# Altium footprint library Connectors SMD.PcbLib: 130 footprints (part 11 of 12) (continued)
## TYCO_120521-1 [mm] "2x32 Position, 1mm Centerline, Surface Mount, Stacking Board-to-Board Female Connector (IEEE 1386 Mezzanine Connector)"
height 5.4
pads (66):
  rect 0.6x2.4 smd: 1(-15.5,-1.8) 2(-15.5,1.8) 3(-14.5,-1.8) 4(-14.5,1.8) 5(-13.5,-1.8) 6(-13.5,1.8) 7(-12.5,-1.8) 8(-12.5,1.8) 9(-11.5,-1.8) 10(-11.5,1.8) 11(-10.5,-1.8) 12(-10.5,1.8) 13(-9.5,-1.8) 14(-9.5,1.8) 15(-8.5,-1.8) 16(-8.5,1.8) 17(-7.5,-1.8) 18(-7.5,1.8) 19(-6.5,-1.8) 20(-6.5,1.8) 21(-5.5,-1.8) 22(-5.5,1.8) 23(-4.5,-1.8) 24(-4.5,1.8) 25(-3.5,-1.8) 26(-3.5,1.8) 27(-2.5,-1.8) 28(-2.5,1.8) 29(-1.5,-1.8) 30(-1.5,1.8) 31(-0.5,-1.8) 32(-0.5,1.8) 33(0.5,-1.8) 34(0.5,1.8) 35(1.5,-1.8) 36(1.5,1.8) 37(2.5,-1.8) 38(2.5,1.8) 39(3.5,-1.8) 40(3.5,1.8) 41(4.5,-1.8) 42(4.5,1.8) 43(5.5,-1.8) 44(5.5,1.8) 45(6.5,-1.8) 46(6.5,1.8) 47(7.5,-1.8) 48(7.5,1.8) 49(8.5,-1.8) 50(8.5,1.8) 51(9.5,-1.8) 52(9.5,1.8) 53(10.5,-1.8) 54(10.5,1.8) 55(11.5,-1.8) 56(11.5,1.8) 57(12.5,-1.8) 58(12.5,1.8) 59(13.5,-1.8) 60(13.5,1.8) 61(14.5,-1.8) 62(14.5,1.8) 63(15.5,-1.8) 64(15.5,1.8)
  round 1 hole 1.5 unplated: 65(-17.2,0) 66(17.2,0)
Top Overlay:
  circle w0.25: c-15.5,-3.6 r0.125
  lines w0.2: -17.95,-0.6 -17.95,-3.025 -16.2,-3.025 -16.2,-1.46 -16.56,-1.46 cw(c-16.56,-0.91) -17.11,-0.91 ; -17.95,0.6 -17.95,3.025 -16.2,3.025 -16.2,1.46 -16.56,1.46 ccw(c-16.56,0.91) -17.11,0.91 ; -16.6,-0.69 -16.1,-0.69 ; -16.6,0.69 -16.1,0.69 ; -16.4,-0.69 -16.4,-0.345 ; -16.4,-0.396 -16.1,-0.396 ; -16.4,0.345 -16.4,0.69 ; -16.4,0.396 -16.1,0.396 ; 16.1,-0.69 16.6,-0.69 ; 16.1,-0.396 16.4,-0.396 ; 16.1,0.396 16.4,0.396 ; 16.1,0.69 16.6,0.69 ; 16.4,-0.69 16.4,-0.345 ; 16.4,0.345 16.4,0.69 ; 17.11,-0.91 cw(c16.56,-0.91) 16.56,-1.46 16.2,-1.46 16.2,-3.025 17.95,-3.025 17.95,-0.6 ; 17.11,0.91 ccw(c16.56,0.91) 16.56,1.46 16.2,1.46 16.2,3.025 17.95,3.025 17.95,0.6
Mechanical 8:
  lines w0.1: -1,0 0,0 0,-1
Mechanical 14:
  drawing of 608 lines, arcs and shapes, not listed
Mechanical 15:
  lines w0.05: -18.2,-3.275 -18.2,3.275 18.2,3.275 18.2,-3.275 -18.2,-3.275
3D body: height 5.4, standoff -0.73, extent -17.95,-3.025 17.95,3.025

## TYCO_120527-1 [mm] "1mm Centerline, FH (IEEE 1386) Surface Mount, Stacking Board-to-Board Male Connectors"
height 8.45
pads (66):
  rect 0.6x2.7 smd: 1(-15.5,1.65) 2(-15.5,-1.65) 3(-14.5,1.65) 4(-14.5,-1.65) 5(-13.5,1.65) 6(-13.5,-1.65) 7(-12.5,1.65) 8(-12.5,-1.65) 9(-11.5,1.65) 10(-11.5,-1.65) 11(-10.5,1.65) 12(-10.5,-1.65) 13(-9.5,1.65) 14(-9.5,-1.65) 15(-8.5,1.65) 16(-8.5,-1.65) 17(-7.5,1.65) 18(-7.5,-1.65) 19(-6.5,1.65) 20(-6.5,-1.65) 21(-5.5,1.65) 22(-5.5,-1.65) 23(-4.5,1.65) 24(-4.5,-1.65) 25(-3.5,1.65) 26(-3.5,-1.65) 27(-2.5,1.65) 28(-2.5,-1.65) 29(-1.5,1.65) 30(-1.5,-1.65) 31(-0.5,1.65) 32(-0.5,-1.65) 33(0.5,1.65) 34(0.5,-1.65) 35(1.5,1.65) 36(1.5,-1.65) 37(2.5,1.65) 38(2.5,-1.65) 39(3.5,1.65) 40(3.5,-1.65) 41(4.5,1.65) 42(4.5,-1.65) 43(5.5,1.65) 44(5.5,-1.65) 45(6.5,1.65) 46(6.5,-1.65) 47(7.5,1.65) 48(7.5,-1.65) 49(8.5,1.65) 50(8.5,-1.65) 51(9.5,1.65) 52(9.5,-1.65) 53(10.5,1.65) 54(10.5,-1.65) 55(11.5,1.65) 56(11.5,-1.65) 57(12.5,1.65) 58(12.5,-1.65) 59(13.5,1.65) 60(13.5,-1.65) 61(14.5,1.65) 62(14.5,-1.65) 63(15.5,1.65) 64(15.5,-1.65)
  round 1 hole 1.5 unplated: 65(-17.2,0) 66(17.2,0)
Top Overlay:
  circle w0.25: c-15.5,3.6 r0.125
  lines w0.2: -17.95,-1.275 ccw(c-16.95,-1.275) -16.95,-2.275 ; -17.95,-1 -17.95,-3.025 -16.95,-3.025 -16.95,-2.275 ; -17.95,1 -17.95,3.025 -16.95,3.025 -16.95,2.275 ; -17.95,1.275 cw(c-16.95,1.275) -16.95,2.275 ; -17.29,-1 -17.29,-1.2 ccw(c-16.84,-1.2) -16.84,-1.65 -16.3,-1.65 -16.3,-2 -16,-2 ; -17.29,1 -17.29,1.2 cw(c-16.84,1.2) -16.84,1.65 -16.3,1.65 -16.3,2 -16,2 ; -16.15,-0.5 -16.15,0.5 ; -16.15,0 16.15,0 ; -16,-2.575 -16.75,-2.575 -16.75,-2.275 -16.95,-2.275 ; -16,2.575 -16.75,2.575 -16.75,2.275 -16.95,2.275 ; 16,-2.575 16.75,-2.575 16.75,-2.275 16.95,-2.275 ; 16,-2 16.3,-2 16.3,-1.65 16.84,-1.65 ccw(c16.84,-1.2) 17.29,-1.2 17.29,-1 ; 16,2 16.3,2 16.3,1.65 16.84,1.65 cw(c16.84,1.2) 17.29,1.2 17.29,1 ; 16,2.575 16.75,2.575 16.75,2.275 16.95,2.275 ; 16.15,-0.5 16.15,0.5 ; 17.95,-1.275 cw(c16.95,-1.275) 16.95,-2.275 ; 17.95,-1 17.95,-3.025 16.95,-3.025 16.95,-2.275 ; 17.95,1 17.95,3.025 16.95,3.025 16.95,2.275 ; 17.95,1.275 ccw(c16.95,1.275) 16.95,2.275
Mechanical 14:
  drawing of 251 lines, arcs and shapes, not listed
Mechanical 15:
  lines w0.05: -18.2,-3.275 -18.2,3.275 18.2,3.275 18.2,-3.275 -18.2,-3.275
3D body: height 8.38, standoff -0.73, extent -17.95,-3.025 17.95,3.025

## TYCO_767139-3 [mm] "114 Positions, Pitch 25 [0.64], Centerline Matched Impedance Vertical Plug (MICTOR)"
height 9.14
pads (130):
  rect 0.43x1.27 smd: 1(-18.415,3.531) 2(-18.415,-3.531) 3(-17.78,3.531) 4(-17.78,-3.531) 5(-17.145,3.531) 6(-17.145,-3.531) 7(-16.51,3.531) 8(-16.51,-3.531) 9(-15.875,3.531) 10(-15.875,-3.531) 11(-15.24,3.531) 12(-15.24,-3.531) 13(-14.605,3.531) 14(-14.605,-3.531) 15(-13.97,3.531) 16(-13.97,-3.531) 17(-13.335,3.531) 18(-13.335,-3.531) 19(-12.7,3.531) 20(-12.7,-3.531) 21(-12.065,3.531) 22(-12.065,-3.531) 23(-11.43,3.531) 24(-11.43,-3.531) 25(-10.795,3.531) 26(-10.795,-3.531) 27(-10.16,3.531) 28(-10.16,-3.531) 29(-9.525,3.531) 30(-9.525,-3.531) 31(-8.89,3.531) 32(-8.89,-3.531) 33(-8.255,3.531) 34(-8.255,-3.531) 35(-7.62,3.531) 36(-7.62,-3.531) 37(-6.985,3.531) 38(-6.985,-3.531) 39(-5.715,3.531) 40(-5.715,-3.531) 41(-5.08,3.531) 42(-5.08,-3.531) 43(-4.445,3.531) 44(-4.445,-3.531) 45(-3.81,3.531) 46(-3.81,-3.531) 47(-3.175,3.531) 48(-3.175,-3.531) 49(-2.54,3.531) 50(-2.54,-3.531) 51(-1.905,3.531) 52(-1.905,-3.531) 53(-1.27,3.531) 54(-1.27,-3.531) 55(-0.635,3.531) 56(-0.635,-3.531) 57(0,3.531) 58(0,-3.531) 59(0.635,3.531) 60(0.635,-3.531) 61(1.27,3.531) 62(1.27,-3.531) 63(1.905,3.531) 64(1.905,-3.531) 65(2.54,3.531) 66(2.54,-3.531) 67(3.175,3.531) 68(3.175,-3.531) 69(3.81,3.531) 70(3.81,-3.531) 71(4.445,3.531) 72(4.445,-3.531) 73(5.08,3.531) 74(5.08,-3.531) 75(5.715,3.531) 76(5.715,-3.531) 77(6.985,3.531) 78(6.985,-3.531) 79(7.62,3.531) 80(7.62,-3.531) 81(8.255,3.531) 82(8.255,-3.531) 83(8.89,3.531) 84(8.89,-3.531) 85(9.525,3.531) 86(9.525,-3.531) 87(10.16,3.531) 88(10.16,-3.531) 89(10.795,3.531) 90(10.795,-3.531) 91(11.43,3.531) 92(11.43,-3.531) 93(12.065,3.531) 94(12.065,-3.531) 95(12.7,3.531) 96(12.7,-3.531) 97(13.335,3.531) 98(13.335,-3.531) 99(13.97,3.531) 100(13.97,-3.531) 101(14.605,3.531) 102(14.605,-3.531) 103(15.24,3.531) 104(15.24,-3.531) 105(15.875,3.531) 106(15.875,-3.531) 107(16.51,3.531) 108(16.51,-3.531) 109(17.145,3.531) 110(17.145,-3.531) 111(17.78,3.531) 112(17.78,-3.531) 113(18.415,3.531) 114(18.415,-3.531)
  round 1.5 hole 0.8: 115(17.78,0) 116(15.24,0) 117(12.7,0) 118(10.16,0) 119(7.62,0) 120(5.08,0) 121(2.54,0) 122(0,0) 123(-2.54,0) 124(-5.08,0) 125(-7.62,0) 126(-10.16,0) 127(-12.7,0) 128(-15.24,0) 129(-17.78,0)
  round 1 hole 2 unplated: 130(-24.13,0)
Top Overlay:
  circle w0.25: c-18.415,4.716 r0.125
  lines w0.2: -25.4,-0.798 -25.4,-1.524 -24.105,-1.524 ; -25.4,0.798 -25.4,1.524 -24.105,1.524 ; -24.105,-1.5 -24.105,-2.642 24.105,-2.642 24.105,-0.635 19.66,-0.635 ; -24.105,1.5 -24.105,1.524 ; -23.707,-1.439 -22.504,-2.642 ; -23.546,2.083 -23.343,1.88 ; -23.343,-1.803 -23.343,-1.277 ; -23.343,1.277 -23.343,1.88 ; -23.266,-1.88 -20.422,-1.88 ; -22.771,-0.635 -19.66,-0.635 ; -22.771,0.635 -22.2,0.635 ; -22.2,-0.635 -22.2,1.27 -19.66,1.27 ; -20.422,-0.635 -20.422,-1.88 ; -20.422,1.27 -20.422,1.88 ; -19.982,-2.642 -20.422,-1.88 ; -19.982,2.642 -20.422,1.88 ; -19.66,-2.642 -19.66,2.642 ; -19.66,-1.714 19.66,-1.714 ; -19.66,1.714 19.66,1.714 ; -6.858,-2.642 -6.858,-1.714 ; -6.858,1.714 -6.858,2.642 ; -5.842,-2.642 -5.842,-1.714 ; -5.842,1.714 -5.842,2.642 ; 5.842,-2.642 5.842,-1.714 ; 5.842,1.714 5.842,2.642 ; 6.858,-2.642 6.858,-1.714 ; 6.858,1.714 6.858,2.642 ; 19.66,-2.642 19.66,2.642 ; 19.66,1.27 22.2,1.27 22.2,-0.635 ; 19.982,-2.642 20.422,-1.88 ; 19.982,2.642 20.422,1.88 ; 20.422,-0.635 20.422,-1.88 ; 20.422,1.27 20.422,1.88 ; 22.2,0.635 24.105,0.635 24.105,1.524 ; 22.504,-2.642 24.105,-1.041 ; 23.266,-1.88 20.422,-1.88 ; 23.343,-1.803 23.343,-0.635 ; 23.343,0.635 23.343,1.88 ; 23.546,2.083 23.343,1.88 ; 24.105,-1.524 25.4,-1.524 25.4,1.524 24.105,1.524 ; -24.105,1.524 -22.987,2.642 22.987,2.642 24.105,1.524 ; -23.343,1.88 -20.422,1.88 ; 20.422,1.88 23.343,1.88
  text "113" at 19.075,3.05 h1
  text "114" at 19.1,-4.025 h1
  text "1" at -19.625,2.95 h1
  text "2" at -19.6,-4.025 h1
Mechanical 8:
  drawing of 812 lines, arcs and shapes, not listed
Mechanical 14:
  drawing of 446 lines, arcs and shapes, not listed
Mechanical 15:
  lines w0.1: -25.65,-4.416 25.65,-4.416 25.65,4.416 -25.65,4.416 -25.65,-4.416
3D body: height 8.86, standoff -1.52, extent -25.4,-4.166 25.4,4.166

## TYCO_969973-5 [mm] "AMPMODU, Pitch 2.54mm, 10 contacts, 2 Rows, Surface Mount Vertical Receptacle"
height 6.2
pads (10):
  rect 1.5x2.33 smd: 1(-5.08,3.035) 2(-5.08,-3.035) 3(-2.54,3.035) 4(-2.54,-3.035) 5(0,3.035) 6(0,-3.035) 7(2.54,3.035) 8(2.54,-3.035) 9(5.08,3.035) 10(5.08,-3.035)
Top Overlay:
  circle w0.25: c-5.08,5.08 r0.125
  lines w0.2: -6.13,-2.53 -6.25,-2.53 -6.25,2.53 -6.13,2.53 ; -4.03,-2.53 -3.59,-2.53 ; -4.03,2.53 -3.59,2.53 ; -1.49,-2.53 -1.05,-2.53 ; -1.49,2.53 -1.05,2.53 ; 1.05,-2.53 1.49,-2.53 ; 1.05,2.53 1.49,2.53 ; 3.59,-2.53 4.03,-2.53 ; 3.59,2.53 4.03,2.53 ; 6.13,-2.53 6.25,-2.53 6.25,2.53 6.13,2.53
Mechanical 8:
  lines w0.1: -5.58,-3.035 -5.08,-3.035 ; -5.58,3.035 -5.08,3.035 ; -5.08,-3.535 -5.08,-3.035 ; -5.08,-2.535 -5.08,-3.035 ; -5.08,2.535 -5.08,3.035 ; -5.08,3.535 -5.08,3.035 ; -4.58,-3.035 -5.08,-3.035 ; -4.58,3.035 -5.08,3.035 ; -3.04,-3.035 -2.54,-3.035 ; -3.04,3.035 -2.54,3.035 ; -2.54,-3.535 -2.54,-3.035 ; -2.54,-2.535 -2.54,-3.035 ; -2.54,2.535 -2.54,3.035 ; -2.54,3.535 -2.54,3.035 ; -2.04,-3.035 -2.54,-3.035 ; -2.04,3.035 -2.54,3.035 ; -0.5,-3.035 0,-3.035 ; -0.5,0 0,0 ; -0.5,3.035 0,3.035 ; 0,-3.535 0,-3.035 ; 0,-2.535 0,-3.035 ; 0,-0.5 0,0 ; 0,0.5 0,0 ; 0,2.535 0,3.035 ; 0,3.535 0,3.035 ; 0.5,-3.035 0,-3.035 ; 0.5,0 0,0 ; 0.5,3.035 0,3.035 ; 2.04,-3.035 2.54,-3.035 ; 2.04,3.035 2.54,3.035 ; 2.54,-3.535 2.54,-3.035 ; 2.54,-2.535 2.54,-3.035 ; 2.54,2.535 2.54,3.035 ; 2.54,3.535 2.54,3.035 ; 3.04,-3.035 2.54,-3.035 ; 3.04,3.035 2.54,3.035 ; 4.58,-3.035 5.08,-3.035 ; 4.58,3.035 5.08,3.035 ; 5.08,-3.535 5.08,-3.035 ; 5.08,-2.535 5.08,-3.035 ; 5.08,2.535 5.08,3.035 ; 5.08,3.535 5.08,3.035 ; 5.58,-3.035 5.08,-3.035 ; 5.58,3.035 5.08,3.035 ; -5.83,-4.2 -4.33,-4.2 -4.33,-1.87 -5.83,-1.87 -5.83,-4.2 ; -5.83,1.87 -5.83,4.2 -4.33,4.2 -4.33,1.87 -5.83,1.87 ; -3.29,-4.2 -1.79,-4.2 -1.79,-1.87 -3.29,-1.87 -3.29,-4.2 ; -3.29,1.87 -3.29,4.2 -1.79,4.2 -1.79,1.87 -3.29,1.87 ; -0.75,-4.2 0.75,-4.2 0.75,-1.87 -0.75,-1.87 -0.75,-4.2 ; -0.75,1.87 -0.75,4.2 0.75,4.2 0.75,1.87 -0.75,1.87 ; 1.79,-4.2 3.29,-4.2 3.29,-1.87 1.79,-1.87 1.79,-4.2 ; 1.79,1.87 1.79,4.2 3.29,4.2 3.29,1.87 1.79,1.87 ; 4.33,-4.2 5.83,-4.2 5.83,-1.87 4.33,-1.87 4.33,-4.2 ; 4.33,1.87 4.33,4.2 5.83,4.2 5.83,1.87 4.33,1.87
Mechanical 14:
  lines w0.1: -8.325,-1.5 -7.675,-1.5 ; -8.325,0.5 -7.675,0.5 ; -5.43,-2.53 -5.43,-3.81 -4.73,-3.81 -4.73,-2.53 ; -5.43,2.53 -5.43,3.81 -4.73,3.81 -4.73,2.53 ; -2.89,-2.53 -2.89,-3.81 -2.19,-3.81 -2.19,-2.53 ; -2.89,2.53 -2.89,3.81 -2.19,3.81 -2.19,2.53 ; -0.35,-2.53 -0.35,-3.81 0.35,-3.81 0.35,-2.53 ; -0.35,2.53 -0.35,3.81 0.35,3.81 0.35,2.53 ; 2.19,-2.53 2.19,-3.81 2.89,-3.81 2.89,-2.53 ; 2.19,2.53 2.19,3.81 2.89,3.81 2.89,2.53 ; 4.73,-2.53 4.73,-3.81 5.43,-3.81 5.43,-2.53 ; 4.73,2.53 4.73,3.81 5.43,3.81 5.43,2.53 ; 7.675,-0.5 8.325,-0.5 ; 7.675,1.5 8.325,1.5 ; -8.325,-3.15 8.325,-3.15 ; -8.325,-3.15 -7.675,-2.5 ; -8.325,-3.15 -8.325,3.15 ; -8.325,3.15 8.325,3.15 ; -8.325,3.15 -7.675,2.5 ; -7.675,-2.5 -7.675,2.5 ; -7.675,-2.5 7.675,-2.5 ; -7.675,2.5 7.675,2.5 ; 7.675,-2.5 7.675,2.5 ; 7.675,-2.5 8.325,-3.15 ; 7.675,-2.5 8.325,-3.15 ; 7.675,2.5 8.325,3.15 ; 7.675,2.5 8.325,3.15 ; 8.325,-3.15 8.325,3.15 ; -6.5,-4.25 -5.5,-4.25 -6,-3.75 -6.5,-4.25 ; -6.25,-2.53 -6.25,2.53 6.25,2.53 6.25,-2.53 -6.25,-2.53
Mechanical 15:
  lines w0.1: -6.5,-4.45 -6.5,4.45 6.5,4.45 6.5,-4.45 -6.5,-4.45
3D body: height 6.2, standoff 0, extent -6.25,-3.81 6.25,3.81

## TYCO_1367073-1 [mm] "20 Position, Pitch 0.8mm SFP Receptacle (Small Form-factor Pluggable)"
height 5.4
pads (22):
  rect 2x0.5 smd: 1(-4.1,3.395) 2(-4.1,2.595) 3(-4.1,1.795) 4(-4.1,0.995) 5(-4.1,0.195) 6(-4.1,-0.605) 7(-4.1,-1.405) 8(-4.1,-2.205) 9(-4.1,-3.005) 10(-4.1,-3.805) 11(4.1,-3.405) 12(4.1,-2.605) 13(4.1,-1.805) 14(4.1,-1.005) 15(4.1,-0.205) 16(4.1,0.595) 17(4.1,1.395) 18(4.1,2.195) 19(4.1,2.995) 20(4.1,3.795)
  round 1 hole 1.55 unplated mask+0.28: MTG1(0,4.795) MTG2(0,-4.805)
Top Layer keep-out:
  lines w0.1: -4.34,-5.755 -4.34,-4.395 -2.88,-4.395 -2.88,-3.855 2.88,-3.855 2.88,-3.995 3.94,-3.995 3.94,-4.805 3.94,-5.755 -4.34,-5.755 ; -4.34,3.985 -4.34,5.745 3.94,5.745 3.94,4.385 2.88,4.385 2.88,3.845 -2.88,3.845 -2.88,3.985 -4.34,3.985
Top Overlay:
  circle w0.25: c-4.955,4.318 r0.125
  lines w0.2: -40,-7.774 -42.4,-7.774 -42.4,7.774 -40,7.774 ; -4,-4.505 -4,-5.505 -0.944,-5.505 ; -3.7,-5.505 -3.7,-4.505 ; -3.7,-5.305 -2.98,-4.705 -2.98,-4.505 ; -3.7,4.045 -3.7,5.495 ; -3.7,4.095 -4,4.095 -4,5.495 -0.944,5.495 ; -3.7,4.432 -2.98,4.495 ; -3.7,5.295 -2.98,4.695 -2.98,4.045 ; -3.223,4.045 -3.223,4.474 ; 0.944,-5.505 2.9,-5.505 3.7,-4.705 3.7,-4.055 ; 0.944,5.495 3.7,5.495 3.7,4.445 ; 5.5,-7.774 6.3,-7.774 6.3,-5.777 ; 5.5,7.774 6.3,7.774 6.3,5.777
Mechanical 8:
  circle w0.1: c0,-4.805 r0.775
  circle w0.1: c0,4.795 r0.775
  lines w0.1: -4.6,-3.805 -4.1,-3.805 -3.6,-3.805 ; -4.6,-3.005 -4.1,-3.005 -3.6,-3.005 ; -4.6,-2.205 -4.1,-2.205 -3.6,-2.205 ; -4.6,-1.405 -4.1,-1.405 -3.6,-1.405 ; -4.6,-0.605 -4.1,-0.605 -3.6,-0.605 ; -4.6,0.195 -4.1,0.195 -3.6,0.195 ; -4.6,0.995 -4.1,0.995 -3.6,0.995 ; -4.6,1.795 -4.1,1.795 -3.6,1.795 ; -4.6,2.595 -4.1,2.595 -3.6,2.595 ; -4.6,3.395 -4.1,3.395 -3.6,3.395 ; -4.1,-4.305 -4.1,3.895 ; -0.5,-4.805 0,-4.805 ; -0.5,0 0,0 ; -0.5,4.795 0,4.795 ; 0,-5.305 0,-4.805 ; 0,-4.305 0,-4.805 ; 0,-0.5 0,0 ; 0,0.5 0,0 ; 0,4.295 0,4.795 ; 0,5.295 0,4.795 ; 0.5,-4.805 0,-4.805 ; 0.5,0 0,0 ; 0.5,4.795 0,4.795 ; 3.6,-3.405 4.1,-3.405 4.6,-3.405 ; 3.6,-2.605 4.1,-2.605 4.6,-2.605 ; 3.6,-1.805 4.1,-1.805 4.6,-1.805 ; 3.6,-1.005 4.1,-1.005 4.6,-1.005 ; 3.6,-0.205 4.1,-0.205 4.6,-0.205 ; 3.6,0.595 4.1,0.595 4.6,0.595 ; 3.6,1.395 4.1,1.395 4.6,1.395 ; 3.6,2.195 4.1,2.195 4.6,2.195 ; 3.6,2.995 4.1,2.995 4.6,2.995 ; 3.6,3.795 4.1,3.795 4.6,3.795 ; 4.1,-3.905 4.1,4.295
Mechanical 14:
  circle w0.1: c-4.955,4.318 r0.125
  lines w0.1: -3.7,-5.505 -3.7,-4.105 ; -3.7,-5.305 -2.98,-4.705 -2.98,-4.505 ; -3.7,-4.442 -2.98,-4.505 ; -3.7,-4.055 -5.1,-4.055 -5.1,-3.555 -3.7,-3.555 ; -3.7,-3.255 -5.1,-3.255 -5.1,-2.755 -3.7,-2.755 ; -3.7,-2.455 -5.1,-2.455 -5.1,-1.955 -3.7,-1.955 ; -3.7,-1.655 -5.1,-1.655 -5.1,-1.155 -3.7,-1.155 ; -3.7,-0.855 -5.1,-0.855 -5.1,-0.355 -3.7,-0.355 ; -3.7,-0.055 -5.1,-0.055 -5.1,0.445 -3.7,0.445 ; -3.7,0.745 -5.1,0.745 -5.1,1.245 -3.7,1.245 ; -3.7,1.545 -5.1,1.545 -5.1,2.045 -3.7,2.045 ; -3.7,2.345 -5.1,2.345 -5.1,2.845 -3.7,2.845 ; -3.7,3.145 -5.1,3.145 -5.1,3.645 -3.7,3.645 ; -3.7,4.432 -2.98,4.495 ; -3.7,5.295 -2.985,4.695 -2.98,4.695 -2.98,4.495 ; -3.7,5.495 -3.7,4.095 ; -3.223,-4.484 -3.223,4.474 ; 3.7,-3.655 5.1,-3.655 5.1,-3.155 3.7,-3.155 ; 3.7,-2.855 5.1,-2.855 5.1,-2.355 3.7,-2.355 ; 3.7,-2.055 5.1,-2.055 5.1,-1.555 3.7,-1.555 ; 3.7,-1.255 5.1,-1.255 5.1,-0.755 3.7,-0.755 ; 3.7,-0.455 5.1,-0.455 5.1,0.045 3.7,0.045 ; 3.7,0.345 5.1,0.345 5.1,0.845 3.7,0.845 ; 3.7,1.145 5.1,1.145 5.1,1.645 3.7,1.645 ; 3.7,1.945 5.1,1.945 5.1,2.445 3.7,2.445 ; 3.7,2.745 5.1,2.745 5.1,3.245 3.7,3.245 ; 3.7,3.545 5.1,3.545 5.1,4.045 3.7,4.045 ; -3.7,-4.105 -3.7,4.095 ; -3.7,-4.105 -4,-4.105 -4,-5.505 2.9,-5.505 3.7,-4.705 3.7,5.495 -4,5.495 -4,4.095 -3.7,4.095 ; -2.98,-4.505 -2.98,4.495
3D body: height 5.22, standoff -0.81, extent -4.5,-5.505 4.5,5.495

## TYCO_1734035-1 [mm] "SMD, Right Angle, 5 Position, Type B, Mini USB Receptacle"
height 3.95
pads (11):
  rect 0.5x2.3 smd: 1(-1.575,0) 2(-0.8,0) 3(0,0) 4(0.8,0) 5(1.6,0)
  rect 2x2.5 smd: 6(-4.45,-5.6) 6(-4.45,-0.1) 6(4.45,-5.6) 6(4.45,-0.1)
  round 0.5 hole 0.9 unplated mask+0.2: MTG1(-2.2,-2.6) MTG2(2.2,-2.6)
Top Overlay:
  drawing of 2951 lines, arcs and shapes, not listed
Mechanical 8:
  circle w0.1: c2.2,-2.6 r0.45
  circle w0.1: c-2.2,-2.6 r0.45
  lines w0.1: -4.95,-5.6 -4.45,-5.6 ; -4.95,-0.1 -4.45,-0.1 ; -4.45,-7.85 0,-7.85 4.45,-7.85 ; -4.45,-6.1 -4.45,-5.6 ; -4.45,-5.1 -4.45,-5.6 ; -4.45,-0.6 -4.45,-0.1 ; -4.45,0.4 -4.45,-0.1 ; -3.95,-5.6 -4.45,-5.6 ; -3.95,-0.1 -4.45,-0.1 ; -2.7,-2.6 -2.2,-2.6 ; -2.2,-3.1 -2.2,-2.6 ; -2.2,-2.1 -2.2,-2.6 ; -2.1,0 -1.6,0 ; -1.7,-2.6 -2.2,-2.6 ; -1.6,-0.5 -1.6,0 ; -1.6,0.5 -1.6,0 ; -0.8,-0.5 -0.8,0 ; -0.8,0.5 -0.8,0 ; 0,-0.5 0,0 ; 0,0.5 0,0 ; 0.8,-0.5 0.8,0 ; 0.8,0.5 0.8,0 ; 1.6,-0.5 1.6,0 ; 1.6,0.5 1.6,0 ; 1.7,-2.6 2.2,-2.6 ; 2.1,0 1.6,0 ; 2.2,-3.1 2.2,-2.6 ; 2.2,-2.1 2.2,-2.6 ; 2.7,-2.6 2.2,-2.6 ; 3.95,-5.6 4.45,-5.6 ; 3.95,-0.1 4.45,-0.1 ; 4.45,-6.1 4.45,-5.6 ; 4.45,-5.1 4.45,-5.6 ; 4.45,-0.6 4.45,-0.1 ; 4.45,0.4 4.45,-0.1 ; 4.95,-5.6 4.45,-5.6 ; 4.95,-0.1 4.45,-0.1 ; -1.6,0 -0.8,0 ; -0.8,0 0,0 ; 0,0 0.8,0 ; 0.8,0 1.6,0 ; -5.45,-6.85 -3.45,-6.85 -3.45,-4.35 -5.45,-4.35 -5.45,-6.85 ; -5.45,-1.35 -3.45,-1.35 -3.45,1.15 -5.45,1.15 -5.45,-1.35 ; -1.85,-1.15 -1.85,1.15 -1.35,1.15 -1.35,-1.15 -1.85,-1.15 ; -1.05,-1.15 -1.05,1.15 -0.55,1.15 -0.55,-1.15 -1.05,-1.15 ; -0.25,-1.15 -0.25,1.15 0.25,1.15 0.25,-1.15 -0.25,-1.15 ; 0.55,-1.15 0.55,1.15 1.05,1.15 1.05,-1.15 0.55,-1.15 ; 1.35,-1.15 1.35,1.15 1.85,1.15 1.85,-1.15 1.35,-1.15 ; 3.45,-6.85 5.45,-6.85 5.45,-4.35 3.45,-4.35 3.45,-6.85 ; 3.45,-1.35 5.45,-1.35 5.45,1.15 3.45,1.15 3.45,-1.35
Mechanical 14:
  drawing of 2963 lines, arcs and shapes, not listed
3D body: height 4.14, standoff -0.95, extent -4.95,-8.5 4.95,0.7

## TYCO_1888247-1 [mm] "20 Position, Pitch 0.8mm SFP Receptacle (Small Form-factor Pluggable)"
height 5.4
pads (22):
  rect 2x0.5 smd: 1(-4.1,3.395) 2(-4.1,2.595) 3(-4.1,1.795) 4(-4.1,0.995) 5(-4.1,0.195) 6(-4.1,-0.605) 7(-4.1,-1.405) 8(-4.1,-2.205) 9(-4.1,-3.005) 10(-4.1,-3.805) 11(4.1,-3.405) 14(4.1,-1.005) 15(4.1,-0.205) 16(4.1,0.595) 17(4.1,1.395) 20(4.1,3.795)
  rect 1.5x0.4 smd: 12(4.1,-2.605) 13(4.1,-1.805) 18(4.1,2.195) 19(4.1,2.995)
  round 1 hole 1.55 unplated mask+0.28: MTG1(0,4.795) MTG2(0,-4.805)
Top Layer keep-out:
  lines w0.1: -4.34,-5.755 3.94,-5.755 3.94,-4.805 3.94,-3.995 2.88,-3.995 2.88,-3.855 -2.88,-3.855 -2.88,-4.395 -4.34,-4.395 -4.34,-5.755 ; -4.34,3.985 -2.88,3.985 -2.88,3.845 2.88,3.845 2.88,4.385 3.94,4.385 3.94,5.745 -4.34,5.745 -4.34,3.985
Top Overlay:
  circle w0.25: c-4.955,4.318 r0.125
  lines w0.2: -40,-7.774 -42.4,-7.774 -42.4,7.774 -40,7.774 ; -4,-4.505 -4,-5.505 -0.944,-5.505 ; -3.7,-5.505 -3.7,-4.505 ; -3.7,-5.305 -2.98,-4.705 -2.98,-4.505 ; -3.7,4.045 -3.7,5.495 ; -3.7,4.095 -4,4.095 -4,5.495 -0.944,5.495 ; -3.7,4.432 -2.98,4.495 ; -3.7,5.295 -2.98,4.695 -2.98,4.045 ; -3.223,4.045 -3.223,4.474 ; 0.944,-5.505 2.9,-5.505 3.7,-4.705 3.7,-4.055 ; 0.944,5.495 3.7,5.495 3.7,4.445 ; 5.5,-7.774 6.3,-7.774 6.3,-5.777 ; 5.5,7.774 6.3,7.774 6.3,5.777
Mechanical 8:
  circle w0.1: c0,4.795 r0.775
  circle w0.1: c0,-4.805 r0.775
  lines w0.1: -4.6,-3.805 -4.1,-3.805 -3.6,-3.805 ; -4.6,-3.005 -4.1,-3.005 -3.6,-3.005 ; -4.6,-2.205 -4.1,-2.205 -3.6,-2.205 ; -4.6,-1.405 -4.1,-1.405 -3.6,-1.405 ; -4.6,-0.605 -4.1,-0.605 -3.6,-0.605 ; -4.6,0.195 -4.1,0.195 -3.6,0.195 ; -4.6,0.995 -4.1,0.995 -3.6,0.995 ; -4.6,1.795 -4.1,1.795 -3.6,1.795 ; -4.6,2.595 -4.1,2.595 -3.6,2.595 ; -4.6,3.395 -4.1,3.395 -3.6,3.395 ; -4.1,-4.305 -4.1,3.895 ; -0.5,-4.805 0,-4.805 ; -0.5,0 0,0 ; -0.5,4.795 0,4.795 ; 0,-5.305 0,-4.805 ; 0,-4.305 0,-4.805 ; 0,-0.5 0,0 ; 0,0.5 0,0 ; 0,4.295 0,4.795 ; 0,5.295 0,4.795 ; 0.5,-4.805 0,-4.805 ; 0.5,0 0,0 ; 0.5,4.795 0,4.795 ; 3.6,-3.405 4.1,-3.405 4.6,-3.405 ; 3.6,-2.605 4.1,-2.605 4.6,-2.605 ; 3.6,-1.805 4.1,-1.805 4.6,-1.805 ; 3.6,-1.005 4.1,-1.005 4.6,-1.005 ; 3.6,-0.205 4.1,-0.205 4.6,-0.205 ; 3.6,0.595 4.1,0.595 4.6,0.595 ; 3.6,1.395 4.1,1.395 4.6,1.395 ; 3.6,2.195 4.1,2.195 4.6,2.195 ; 3.6,2.995 4.1,2.995 4.6,2.995 ; 3.6,3.795 4.1,3.795 4.6,3.795 ; 4.1,-3.905 4.1,4.295
Mechanical 14:
  circle w0.1: c-4.955,4.318 r0.125
  lines w0.1: -3.7,-5.505 -3.7,-4.105 ; -3.7,-5.305 -2.98,-4.705 -2.98,-4.505 ; -3.7,-4.442 -2.98,-4.505 ; -3.7,-4.055 -5.1,-4.055 -5.1,-3.555 -3.7,-3.555 ; -3.7,-3.255 -5.1,-3.255 -5.1,-2.755 -3.7,-2.755 ; -3.7,-2.455 -5.1,-2.455 -5.1,-1.955 -3.7,-1.955 ; -3.7,-1.655 -5.1,-1.655 -5.1,-1.155 -3.7,-1.155 ; -3.7,-0.855 -5.1,-0.855 -5.1,-0.355 -3.7,-0.355 ; -3.7,-0.055 -5.1,-0.055 -5.1,0.445 -3.7,0.445 ; -3.7,0.745 -5.1,0.745 -5.1,1.245 -3.7,1.245 ; -3.7,1.545 -5.1,1.545 -5.1,2.045 -3.7,2.045 ; -3.7,2.345 -5.1,2.345 -5.1,2.845 -3.7,2.845 ; -3.7,3.145 -5.1,3.145 -5.1,3.645 -3.7,3.645 ; -3.7,4.432 -2.98,4.495 ; -3.7,5.295 -2.985,4.695 -2.98,4.695 -2.98,4.495 ; -3.7,5.495 -3.7,4.095 ; -3.223,-4.484 -3.223,4.474 ; 3.7,-3.655 5.1,-3.655 5.1,-3.155 3.7,-3.155 ; 3.7,-2.855 4.85,-2.855 4.85,-2.355 3.7,-2.355 ; 3.7,-2.055 4.85,-2.055 4.85,-1.555 3.7,-1.555 ; 3.7,-1.255 5.1,-1.255 5.1,-0.755 3.7,-0.755 ; 3.7,-0.455 5.1,-0.455 5.1,0.045 3.7,0.045 ; 3.7,0.345 5.1,0.345 5.1,0.845 3.7,0.845 ; 3.7,1.145 5.1,1.145 5.1,1.645 3.7,1.645 ; 3.7,1.945 4.85,1.945 4.85,2.445 3.7,2.445 ; 3.7,2.745 4.85,2.745 4.85,3.245 3.7,3.245 ; 3.7,3.545 5.1,3.545 5.1,4.045 3.7,4.045 ; -3.7,-4.105 -3.7,4.095 ; -3.7,-4.105 -4,-4.105 -4,-5.505 2.9,-5.505 3.7,-4.705 3.7,5.495 -4,5.495 -4,4.095 -3.7,4.095 ; -2.98,-4.505 -2.98,4.495
Mechanical 15:
  lines w0.1: -5.325,-5.755 5.375,-5.755 5.375,5.745 -5.325,5.745 -5.325,-5.755
3D body: height 5.22, standoff -0.8, extent -4.5,-5.505 4.5,5.495

## TYCO_5767007-8 [mm] "38 Positions, Pitch 25 [0.64], Centerline Matched Impedance Vertical Plug Connector (MICTOR)"
height 6.81
pads (44):
  rect 0.43x1.27 smd: 1(-5.715,3.53) 2(-5.715,-3.53) 3(-5.08,3.53) 4(-5.08,-3.53) 5(-4.445,3.53) 6(-4.445,-3.53) 7(-3.81,3.53) 8(-3.81,-3.53) 9(-3.175,3.53) 10(-3.175,-3.53) 11(-2.54,3.53) 12(-2.54,-3.53) 13(-1.905,3.53) 14(-1.905,-3.53) 15(-1.27,3.53) 16(-1.27,-3.53) 17(-0.635,3.53) 18(-0.635,-3.53) 19(0,3.53) 20(0,-3.53) 21(0.635,3.53) 22(0.635,-3.53) 23(1.27,3.53) 24(1.27,-3.53) 25(1.905,3.53) 26(1.905,-3.53) 27(2.54,3.53) 28(2.54,-3.53) 29(3.175,3.53) 30(3.175,-3.53) 31(3.81,3.53) 32(3.81,-3.53) 33(4.445,3.53) 34(4.445,-3.53) 35(5.08,3.53) 36(5.08,-3.53) 37(5.715,3.53) 38(5.715,-3.53)
  round 1.5 hole 0.8: 39(-5.08,0) 40(-2.54,0) 41(0,0) 42(2.54,0) 43(5.08,0)
  round 1 hole 2 unplated: 44(-11.43,0)
Top Overlay:
  circle w0.25: c-6.9,3.53 r0.125
  lines w0.2: -11.405,-1.325 -11.405,-1.575 ; -11.405,1.325 -11.405,1.575 ; -11.1,-1.88 -7.678,-1.88 ; -11.1,1.88 -7.678,1.88 ; -10.338,-2.642 -11.405,-1.575 ; -10.1,-0.635 -6.96,-0.635 ; -10.1,0.635 -9.5,0.635 ; -9.5,-0.635 -9.5,1.27 -6.96,1.27 ; -7.678,-0.635 -7.678,-1.88 ; -7.678,1.27 -7.678,1.88 ; -7.238,-2.642 -7.678,-1.88 ; -7.238,2.642 -7.678,1.88 ; -6.96,-2.642 -6.96,2.642 ; -6.96,-1.714 6.96,-1.714 ; -6.96,1.714 6.96,1.714 ; -6.239,-2.642 -11.405,-2.642 -11.405,-1.575 ; -6.239,2.642 -10.338,2.642 -11.405,1.575 ; -5.974,-0.724 -6.401,-0.724 -6.401,0.724 -5.974,0.724 ; 5.974,-0.724 6.401,-0.724 6.401,0.724 5.974,0.724 ; 6.239,-2.642 11.405,-2.642 11.405,-1.575 ; 6.239,2.642 10.338,2.642 11.405,1.575 ; 6.96,-2.642 6.96,2.642 ; 6.96,-0.635 11.405,-0.635 11.405,-1.575 ; 6.96,1.27 9.5,1.27 9.5,-0.635 ; 7.238,-2.642 7.678,-1.88 ; 7.238,2.642 7.678,1.88 ; 7.678,-0.635 7.678,-1.88 ; 7.678,1.27 7.678,1.88 ; 9.5,0.635 11.405,0.635 11.405,1.575 ; 10.338,-2.642 11.405,-1.575 ; 11.1,-1.88 7.678,-1.88 ; 11.1,1.88 7.678,1.88 ; -11.405,-1.575 -12.7,-1.575 -12.7,1.575 -11.405,1.575 ; 11.405,-1.575 12.7,-1.575 12.7,1.575 11.405,1.575
  text "2" at -7.15,-4.086 h1
  text "38" at 6.4,-4.074 h1
  text "37" at 6.425,3.086 h1
Mechanical 8:
  drawing of 290 lines, arcs and shapes, not listed
Mechanical 14:
  circle w0.1: c-6.9,3.53 r0.25
  lines w0.1: -11.1,-1.88 -7.678,-1.88 ; -11.1,1.88 -7.678,1.88 ; -10.338,-2.642 -11.405,-1.575 -12.7,-1.575 -12.7,1.575 -11.405,1.575 ; -9.5,-0.635 -9.5,1.27 -6.96,1.27 ; -9.5,0.635 -11.405,0.635 -11.405,1.575 ; -7.678,-0.635 -7.678,-1.88 ; -7.678,1.27 -7.678,1.88 ; -7.238,-2.642 -7.678,-1.88 ; -7.238,2.642 -7.678,1.88 ; -6.96,-2.642 -6.96,2.642 ; -6.96,-1.714 6.96,-1.714 ; -6.96,-0.635 -11.405,-0.635 -11.405,-2.642 11.405,-2.642 11.405,-0.635 6.96,-0.635 ; -6.96,1.714 6.96,1.714 ; -2.691,2.642 -2.691,2.667 -0.47,2.667 -0.47,2.642 ; -1.812,2.642 -1.812,2.667 ; -0.272,2.642 -0.272,2.667 2.576,2.667 2.576,2.642 ; 0.876,2.642 0.876,2.667 ; 1.152,2.642 1.152,2.667 ; 1.428,2.642 1.428,2.667 ; 2.618,2.642 2.618,2.667 5.08,2.667 5.08,2.642 ; 3.35,2.642 3.35,2.667 ; 4.348,2.642 4.348,2.667 ; 6.96,-2.642 6.96,2.642 ; 6.96,1.27 9.5,1.27 9.5,-0.635 ; 7.238,-2.642 7.678,-1.88 ; 7.238,2.642 7.678,1.88 ; 7.678,-0.635 7.678,-1.88 ; 7.678,1.27 7.678,1.88 ; 9.5,0.635 11.405,0.635 11.405,1.575 ; 10.338,-2.642 11.405,-1.575 12.7,-1.575 12.7,1.575 11.405,1.575 ; 11.1,-1.88 7.678,-1.88 ; 11.1,1.88 7.678,1.88 ; -11.405,1.575 -10.338,2.642 10.338,2.642 11.405,1.575 ; -6.401,-0.724 6.401,-0.724 6.401,0.724 -6.401,0.724 -6.401,-0.724
  text "2" at -7.15,-4.086 h1
  text "38" at 6.4,-4.074 h1
  text "37" at 6.425,3.086 h1
Mechanical 15:
  lines w0.1: -12.95,-4.415 -12.95,4.415 12.95,4.415 12.95,-4.415 -12.95,-4.415
3D body: height 6.53, standoff -1.37, extent -12.7,-4.356 12.7,4.356